# Altium footprint library TIDA_00620.PcbLib: 53 footprints (part 2 of 4)
Each footprint in its own frame and in the unit in brackets; x right, y up, seen from the top. Pads: shape width x height; smd on the part's side, far side on the other; paste and mask are expansions set on the pad; w line width, h text height; cw(c..) or ccw(c..) is an arc to the next point about the centre after c.
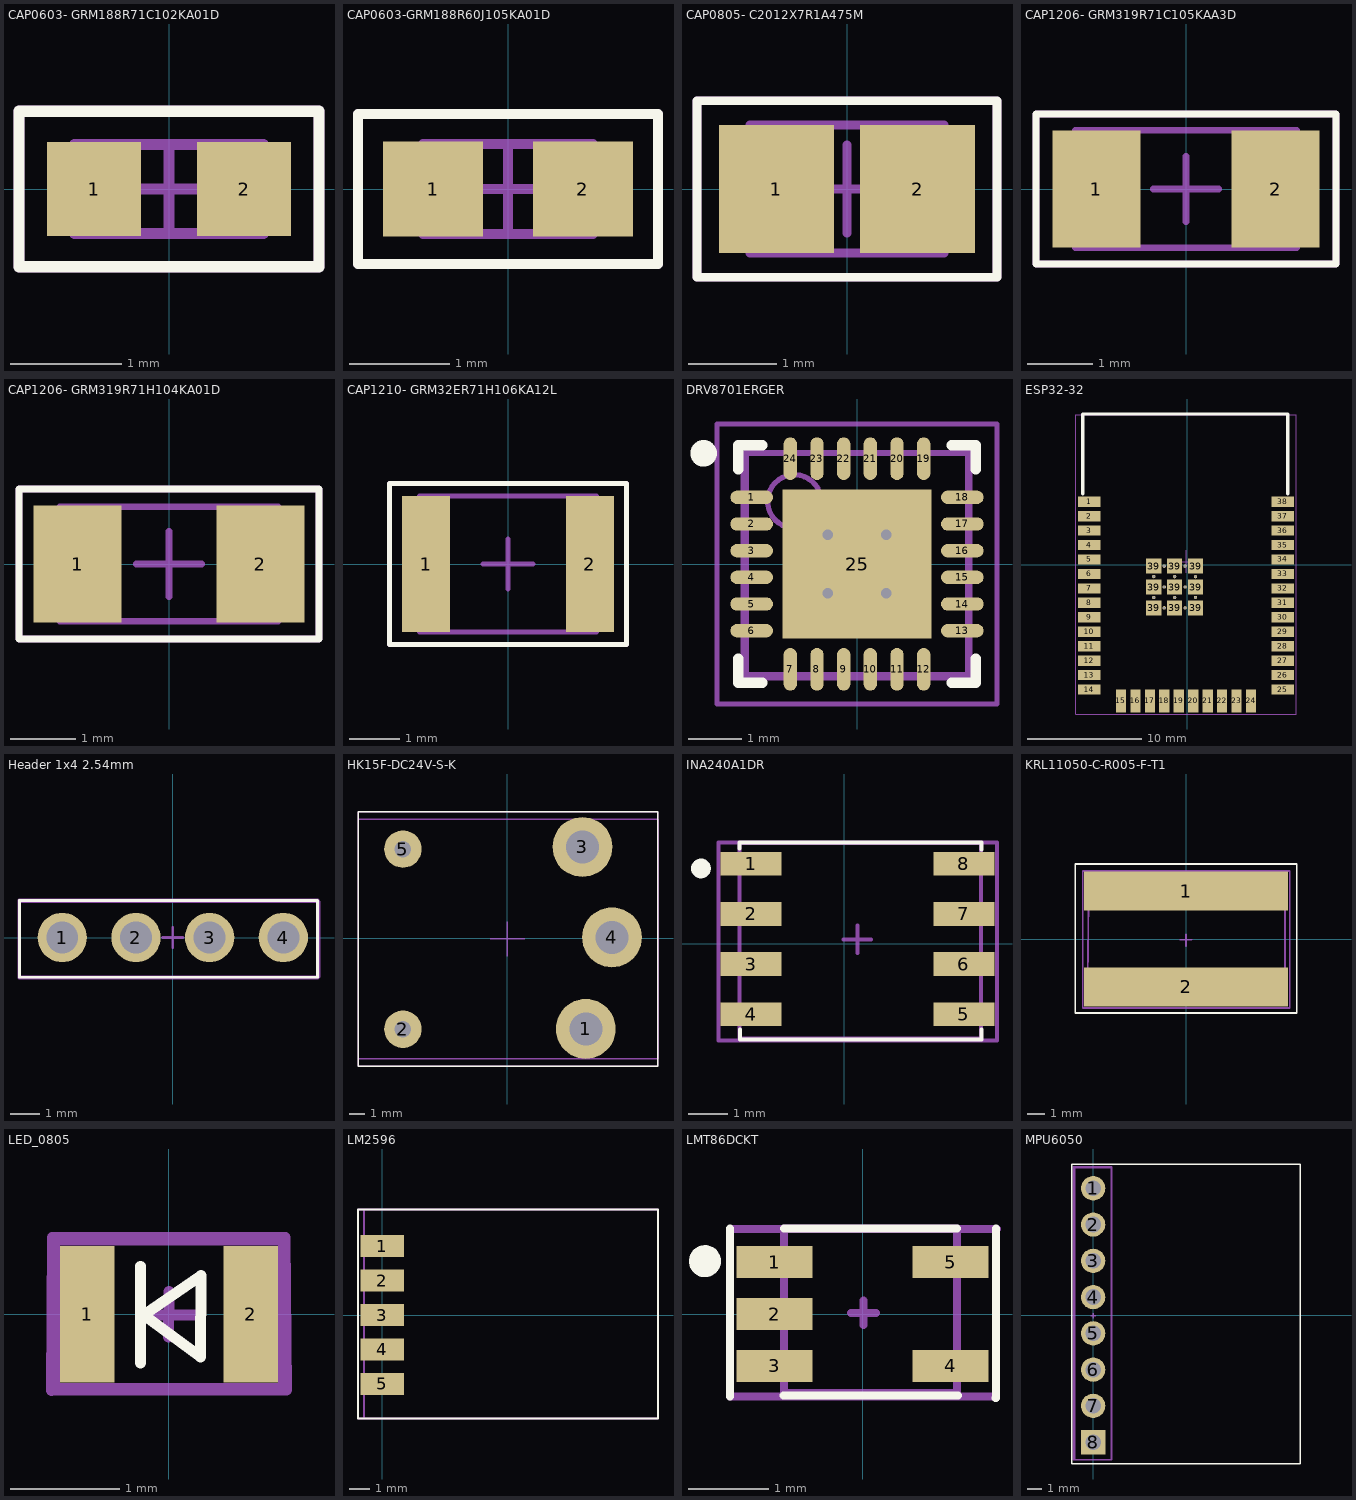
[diagram p1: the footprints below, top view; thin cyan lines are the x and y axes]

## CAP0603- GRM188R71C102KA01D [mm] "Chip Capacitor, 2-Leads, Body 1,60x0,75mm, IPC Medium Density"
height 0.9
pads (2):
  rect 0.85x0.85 smd mask+0.05: 1(-0.675,0) 2(0.675,0)
Top Overlay:
  lines w0.1: -1.35,-0.7 1.35,-0.7 1.35,0.7 -1.35,0.7 -1.35,-0.7
Top 3D Body:
  lines w0.1: -0.85,-0.4 0.85,-0.4 0.85,0.4 -0.85,0.4 -0.85,-0.4
Top Component Center:
  lines w0.1: -0.4,0 0.4,0 ; 0,-0.4 0,0.4 ; -1.35,-0.7 1.35,-0.7 1.35,0.7 -1.35,0.7 -1.35,-0.7
Top Designator:
  text ".Designator" at -0.649,-0.167 h0.5
3D body: height 0.9, standoff 0, extent 0.5,-0.4 0.85,0.4
3D body: height 0.9, standoff 0, extent -0.85,-0.4 -0.5,0.4
3D body: height 0.9, standoff 0, extent -0.5,-0.4 0.5,0.4

## CAP0603-GRM188R60J105KA01D [mm] "Chip Capacitor, 2-Leads, Body 1,60x0,80mm, IPC Medium Density"
height 0.9
pads (2):
  rect 1x0.95 smd mask+0.05: 1(-0.75,0) 2(0.75,0)
Top Overlay:
  lines w0.1: -1.5,-0.75 -1.5,0.75 1.5,0.75 1.5,-0.75 -1.5,-0.75
Top 3D Body:
  lines w0.1: -0.85,-0.45 -0.85,0.45 0.85,0.45 0.85,-0.45 -0.85,-0.45
Top Component Center:
  lines w0.1: -0.45,0 0.45,0 ; 0,-0.45 0,0.45 ; -1.5,-0.75 -1.5,0.75 1.5,0.75 1.5,-0.75 -1.5,-0.75
Top Designator:
  text ".Designator" at -0.167,-0.267 h0.5
3D body: height 0.9, standoff 0, extent -0.5,-0.45 0.5,0.45
3D body: height 0.9, standoff 0, extent -0.85,-0.45 -0.5,0.45
3D body: height 0.9, standoff 0, extent 0.5,-0.45 0.85,0.45

## CAP0805- C2012X7R1A475M [mm] "Chip Capacitor, 2-Leads, Body 2,00x1,25mm, IPC Medium Density"
height 1.45
pads (2):
  rect 1.3x1.45 smd mask+0.05: 1(-0.8,0) 2(0.8,0)
Top Overlay:
  lines w0.1: -1.7,-1 1.7,-1 1.7,1 -1.7,1 -1.7,-1
Top 3D Body:
  lines w0.1: -1.1,-0.725 1.1,-0.725 1.1,0.725 -1.1,0.725 -1.1,-0.725
Top Component Center:
  lines w0.1: -0.5,0 0.5,0 ; 0,-0.5 0,0.5 ; -1.7,-1 1.7,-1 1.7,1 -1.7,1 -1.7,-1
Top Designator:
  text ".Designator" at -0.535,-0.241 h0.5
3D body: height 1.45, standoff 0, extent 0.6,-0.725 1.1,0.725
3D body: height 1.45, standoff 0, extent -1.1,-0.725 -0.6,0.725
3D body: height 1.45, standoff 0, extent -0.6,-0.725 0.6,0.725

## CAP1206- GRM319R71C105KAA3D [mm] "Chip Capacitor, 2-Leads, Body 3,20x1,60mm, IPC Medium Density"
height 0.95
pads (2):
  rect 1.35x1.8 smd mask+0.05: 1(-1.375,0) 2(1.375,0)
Top Overlay:
  lines w0.1: -2.3,-1.15 -2.3,1.15 2.3,1.15 2.3,-1.15 -2.3,-1.15
Top 3D Body:
  lines w0.1: -1.7,-0.9 -1.7,0.9 1.7,0.9 1.7,-0.9 -1.7,-0.9
Top Component Center:
  lines w0.1: -0.5,0 0.5,0 ; 0,-0.5 0,0.5 ; -2.3,-1.15 -2.3,1.15 2.3,1.15 2.3,-1.15 -2.3,-1.15
Top Designator:
  text ".Designator" at -0.367,-0.217 h0.5
3D body: height 0.95, standoff 0, extent -1.15,-0.9 1.15,0.9
3D body: height 0.95, standoff 0, extent -1.7,-0.9 -1.15,0.9
3D body: height 0.95, standoff 0, extent 1.15,-0.9 1.7,0.9

## CAP1206- GRM319R71H104KA01D [mm] "Chip Capacitor, 2-Leads, Body 3,20x1,60mm, IPC Medium Density"
height 0.95
pads (2):
  rect 1.35x1.8 smd mask+0.05: 1(-1.4,0) 2(1.4,0)
Top Overlay:
  lines w0.1: -2.3,-1.15 -2.3,1.15 2.3,1.15 2.3,-1.15 -2.3,-1.15
Top 3D Body:
  lines w0.1: -1.675,-0.875 1.675,-0.875 1.675,0.875 -1.675,0.875 -1.675,-0.875
Top Component Center:
  lines w0.1: -0.5,0 0.5,0 ; 0,-0.5 0,0.5 ; -2.3,-1.15 2.3,-1.15 2.3,1.15 -2.3,1.15 -2.3,-1.15
Top Designator:
  text ".Designator" at -0.267,-0.217 h0.5
3D body: height 0.95, standoff 0, extent 1.125,-0.875 1.675,0.875
3D body: height 0.95, standoff 0, extent -1.675,-0.875 -1.125,0.875
3D body: height 0.95, standoff 0, extent -1.125,-0.875 1.125,0.875

## CAP1210- GRM32ER71H106KA12L [mm] "Chip Capacitor, 2-Leads, Body 3,20x2,50mm, IPC Medium Density"
height 2.7
pads (2):
  rect 0.95x2.7 smd mask+0.05: 1(-1.625,0) 2(1.625,0)
Top Overlay:
  lines w0.1: -2.35,-1.6 -2.35,1.6 2.35,1.6 2.35,-1.6 -2.35,-1.6
Top 3D Body:
  lines w0.1: -1.75,-1.35 -1.75,1.35 1.75,1.35 1.75,-1.35 -1.75,-1.35
Top Component Center:
  lines w0.1: -0.5,0 0.5,0 ; 0,-0.5 0,0.5 ; -2.35,-1.6 -2.35,1.6 2.35,1.6 2.35,-1.6 -2.35,-1.6
Top Designator:
  text ".Designator" at -0.317,-0.217 h0.5
3D body: height 2.7, standoff 0, extent -1.45,-1.35 1.45,1.35
3D body: height 2.7, standoff 0, extent -1.75,-1.35 -1.45,1.35
3D body: height 2.7, standoff 0, extent 1.45,-1.35 1.75,1.35

## DRV8701ERGER [mm] "QFN, 24-Leads, Body 4,00x4,00mm, Pitch 0,50mm, Thermal Pad 2,80x2,80mm, IPC Medium Density"
height 1
pads (25):
  oval 0.8x0.25 smd mask+0.05: 1(-1.975,1.25) 2(-1.975,0.75) 3(-1.975,0.25) 4(-1.975,-0.25) 5(-1.975,-0.75) 6(-1.975,-1.25) 13(1.975,-1.25) 14(1.975,-0.75) 15(1.975,-0.25) 16(1.975,0.25) 17(1.975,0.75) 18(1.975,1.25)
  oval 0.25x0.8 smd mask+0.05: 7(-1.25,-1.975) 8(-0.75,-1.975) 9(-0.25,-1.975) 10(0.25,-1.975) 11(0.75,-1.975) 12(1.25,-1.975) 19(1.25,1.975) 20(0.75,1.975) 21(0.25,1.975) 22(-0.25,1.975) 23(-0.75,1.975) 24(-1.25,1.975)
  rect 2.8x2.8 smd mask+0.05: 25(0,0)
via 0.55,-0.55 diameter 0.5 hole 0.2
via -0.55,-0.55 diameter 0.5 hole 0.2
via 0.55,0.55 diameter 0.5 hole 0.2
via -0.55,0.55 diameter 0.5 hole 0.2
Top Overlay:
  circle w0.25: c-2.875,2.075 r0.125
  lines w0.2: -2.225,-1.775 -2.225,-2.225 -1.775,-2.225 ; -2.225,1.775 -2.225,2.225 -1.775,2.225 ; 1.775,-2.225 2.225,-2.225 2.225,-1.775 ; 1.775,2.225 2.225,2.225 2.225,1.775
Top 3D Body:
  circle w0.1: c-1.175,1.175 r0.5
  lines w0.1: -2.1,2.07 -2.13,2.07 -2.13,-2.13 2.12,-2.13 2.12,2.07 ; -2.1,2.09 2.12,2.09 ; -2.075,-2.075 2.075,-2.075 2.075,2.075 -2.075,2.075 -2.075,-2.075
Top Component Center:
  lines w0.1: -0.5,0 0.5,0 ; 0,-0.5 0,0.5 ; -2.625,-2.625 2.625,-2.625 2.625,2.625 -2.625,2.625 -2.625,-2.625
3D body: height 1, standoff 0, extent -2.075,-2.075 2.075,2.075

## ESP32-32 [mm]
pads (59):
  rect 2x0.9 smd mask+0.05: 1(-8.608,5.555) 2(-8.608,4.285) 3(-8.608,3.015) 4(-8.608,1.745) 5(-8.608,0.475) 6(-8.608,-0.795) 7(-8.608,-2.065) 8(-8.608,-3.335) 9(-8.608,-4.605) 10(-8.608,-5.875) 11(-8.608,-7.145) 12(-8.608,-8.415) 13(-8.608,-9.685) 14(-8.608,-10.955) 25(8.393,-10.955) 26(8.393,-9.685) 27(8.393,-8.415) 28(8.393,-7.145) 29(8.393,-5.875) 30(8.393,-4.605) 31(8.393,-3.335) 32(8.393,-2.065) 33(8.393,-0.795) 34(8.393,0.475) 35(8.393,1.745) 36(8.393,3.015) 37(8.393,4.285) 38(8.393,5.555)
  rect 0.9x2 smd mask+0.05: 15(-5.823,-11.955) 16(-4.553,-11.955) 17(-3.283,-11.955) 18(-2.013,-11.955) 19(-0.743,-11.955) 20(0.527,-11.955) 21(1.797,-11.955) 22(3.067,-11.955) 23(4.337,-11.955) 24(5.607,-11.955)
  rect 1.33x1.33 smd mask+0.05: 39(-2.943,-3.78) 39(-2.943,-1.945) 39(-2.943,-0.11) 39(-1.108,-3.78) 39(-1.108,-1.945) 39(-1.108,-0.11) 39(0.727,-3.78) 39(0.727,-1.945) 39(0.727,-0.11)
  round 0.3 hole 0.2 mask+0.05: 39(-2.943,-2.862) 39(-2.943,-1.027) 39(-2.025,-3.78) 39(-2.025,-1.945) 39(-2.025,-0.11) 39(-1.108,-2.862) 39(-1.108,-1.027) 39(-0.19,-3.78) 39(-0.19,-1.945) 39(-0.19,-0.11) 39(0.727,-2.862) 39(0.727,-1.027)
Top Overlay:
  lines w0.3: -9.178,6.263 -9.178,13.263 8.822,13.263 8.822,6.263
Top Component Center:
  lines w0.1: -1.108,0.295 0.893,0.295 ; -0.108,-0.705 -0.108,1.295 ; -9.808,-13.105 9.593,-13.105 9.593,13.195 -9.808,13.195 -9.808,-13.105
Top Designator:
  lines w0.1: -9.808,-13.105 9.593,-13.105 9.593,13.195 -9.808,13.195 -9.808,-13.105
  text ".Designator" at -3.953,1.057 h1.52
3D body "ESP-32 .step": height 2.61, standoff -0.1, extent -9.081,-12.305 8.819,13.095

## Header 1x4 2.54mm [mm]
pads (4):
  round 1.7 hole 1.1 paste-2539.97 mask+0.05: 1(-3.81,0) 2(-1.27,0) 3(1.27,0) 4(3.81,0)
Top Overlay:
  lines w0.1: -5.29,1.28 4.99,1.28 4.99,-1.37 -5.28,-1.37 -5.28,1.28 -5.29,1.28
Top 3D Body:
  lines w0.1: -5.3,-1.36 5.04,-1.36 5.04,1.24 -5.2,1.24 -5.3,1.24 -5.3,-1.36
Top Component Center:
  lines w0.1: -0.35,0 0.35,0 ; 0,-0.35 0,0.35 ; -5.3,-1.4 -5.3,1.3 5,1.3 5,-1.4 -5.3,-1.4
Top Designator:
  text ".Designator" at 1.313,-0.162 h0.5
3D body "4PinHeader.step": height 6.5, standoff -2.5, extent -5.21,-1.3 4.95,1.24

## HK15F-DC24V-S-K [mm]
pads (5):
  round 4 hole 2.2 mask+0.05: 1(5.225,-6.06) 3(5.005,6.08) 4(6.975,0.05)
  round 2.5 hole 1.1 mask+0.05: 2(-6.975,-6.08) 5(-6.975,5.94)
Top Overlay:
  lines w0.1: -9.975,-8.56 -9.975,8.44 -9.875,8.44 10.025,8.44 10.025,-8.56 -9.975,-8.56
Top 3D Body:
  lines w0.1: -9.955,-8.06 -9.955,7.94 10.045,7.94 10.045,-8.06 -9.955,-8.06
Top Component Center:
  lines w0.1: -1.15,-0.05 1.15,-0.05 ; 0,-1.2 0,1.1 ; -9.975,-8.56 -9.975,8.44 10.025,8.44 10.025,-8.56 -9.975,-8.56
Top Designator:
  text "'.Designator'" at -2.232,-1.352 h1.5
3D body "User Library-RELAY  12MMx12MM SQUARE.step": height 2, standoff -15, extent -9.955,-8.06 10.045,7.94

## INA240A1DR [mm]
pads (8):
  rect 1.55x0.6 smd mask+0.05: 1(-2.37,2.025) 2(-2.37,0.755) 3(-2.37,-0.515) 4(-2.37,-1.785) 5(3.03,-1.785) 6(3.03,-0.515) 7(3.03,0.755) 8(3.03,2.025)
Top Overlay:
  circle w0.3: c-3.64,1.91 r0.1
  lines w0.1: -2.66,2.42 -2.66,2.57 3.48,2.57 3.48,2.39 3.47,2.39 ; -2.65,-2.17 -2.65,-2.43 3.48,-2.43 3.48,-2.17
Top 3D Body:
  lines w0.1: -2.6,2.555 -2.66,2.555 ; -2.66,2.555 3.46,2.555 3.46,-2.405 -2.66,-2.405 -2.66,2.555
Top Component Center:
  lines w0.1: -0.02,0.11 0.68,0.11 ; 0.33,-0.24 0.33,0.46 ; -3.2,-2.46 3.87,-2.46 3.87,2.57 -3.2,2.57 -3.2,-2.46
Top Designator:
  text "'.Designator'" at -1.21,-0.61 h1.5
3D body "INA240A1D.STEP": height 1.75, standoff 0, extent -2.595,-2.347 3.395,2.558

## KRL11050-C-R005-F-T1 [mm]
pads (2):
  rect 11.5x2.2 smd mask+0.05: 1(0,2.7) 2(0,-2.7)
Top Overlay:
  lines w0.1: -6.24,-4.17 -6.24,4.22 6.24,4.22 6.24,-4.17 -6.24,-4.17
Top 3D Body:
  lines w0.1: -5.53,-2.61 -5.5,2.51 5.58,2.43 5.58,-2.61 -5.53,-2.61
Top Component Center:
  lines w0.1: -5.77,3.83 -5.82,3.83 ; -0.336,-0.041 0.324,-0.041 ; 0,-0.39 0,0.27 ; -5.82,3.83 5.84,3.83 5.84,-3.89 -5.82,-3.89 -5.82,3.83
Top Designator:
  text ".Designator" at -0.629,-0.167 h0.5
3D body "KRL11050-C-R005-F-T1.STEP": height 0.7, standoff 0, extent -5.48,-2.55 5.52,2.45

## LED_0805 [mm] "LTST-C170KRKT, LTST-C171GKT"
pads (2):
  rect 0.5x1.25 smd mask+0.05: 1(-0.749,0) 2(0.749,0)
Top Overlay:
  lines w0.1: -0.26,-0.445 -0.26,0.44 ; -0.23,-0.005 0.29,-0.39 0.295,0.355 -0.23,-0.005
Top 3D Body:
  lines w0.1: -1.05,-0.68 1.05,-0.68 1.05,0.68 -1.05,0.68 -1.05,-0.68
Top Component Center:
  lines w0.1: -0.225,-0.005 0.245,-0.005 ; -0.005,-0.21 0,0.21 ; -1.075,-0.7 1.075,-0.695 1.065,0.705 -1.07,0.705 -1.075,-0.7
Top Designator:
  text ".Designator" at -0.312,-0.277 h0.5
3D body "LTST-C170KRKT.STEP": height 1.1, standoff 0, extent -1,-0.625 1,0.625

## LM2596 [mm] "LM2596 SIMPLE SWITCHER® Power Converter 150-kHz / 3-A Step-Down Voltage Regulator"
pads (5):
  rect 2.16x1.07 smd mask+0.05: 1(0,3.4) 2(0,1.7) 3(0,0) 4(0,-1.7) 5(0,-3.4)
Top Overlay:
  lines w0.1: -1.2,-5.1 -1.2,5.2 13.6,5.2 13.6,-5.1 -1.2,-5.1
Top 3D Body:
  lines w0.1: -0.9,-5.1 13.6,-5.1 13.6,5.2 -0.8,5.2 -0.9,5.2 -0.9,-5.1
Top Component Center:
  lines w0.1: -0.4,0 0.4,0 ; 0,-0.4 0,0.4 ; -1.2,-5.1 -1.2,5.2 13.6,5.2 13.6,-5.1 -1.2,-5.1
3D body "LM2596S-5.0.STEP": height 4.65, standoff -0.15, extent -0.835,-5.03 13.516,5.13

## LMT86DCKT [mm]
pads (5):
  rect 0.95x0.4 smd mask+0.05: 1(-1.1,0.65) 2(-1.1,0) 3(-1.1,-0.65) 4(1.1,-0.65) 5(1.1,0.65)
Top Overlay:
  circle w0.2: c-1.97,0.66 r0.1
  lines w0.1: -1.66,-1.03 -1.66,1.07 ; -0.99,-1.02 1.19,-1.02 ; -0.98,1.07 1.18,1.07 ; 1.66,-1.05 1.67,-1.05 1.67,1.07
Top 3D Body:
  lines w0.1: -0.98,-0.99 -0.98,1.07 -0.97,1.07 1.18,1.07 1.18,-0.99 -0.98,-0.99
Top Component Center:
  lines w0.1: -0.145,0.015 0.165,0.015 ; 0.01,-0.14 0.01,0.17 ; -1.66,-1.03 -1.66,1.04 -1.66,1.06 -0.98,1.06 1.68,1.06 1.67,1.06 1.67,-1.03 -1.66,-1.03
Top Designator:
  text ".Designator" at -0.619,-0.277 h0.5
3D body "LMT86DCKT.STEP": height 1.1, standoff 0, extent -0.97,-0.96 1.13,1.04

## MPU6050 [mm]
pads (8):
  round 1.7 hole 1.1 paste-2539.97 mask+0.05: 1(0,8.89) 2(0,6.35) 3(0,3.81) 4(0,1.27) 5(0,-1.27) 6(0,-3.81) 7(0,-6.35)
  rect 1.7x1.7 hole 1.1 paste-2539.97 mask+0.05: 8(0,-8.89)
Top Overlay:
  lines w0.1: 14.5,-10.42 14.5,10.58 ; 14.5,-10.41 -1.5,-10.41 -1.5,10.59 14.5,10.59
Top 3D Body:
  lines w0.1: -1.3,-10.11 -1.3,10.31 1.25,10.31 1.25,-10.11 -1.3,-10.11
Top Component Center:
  lines w0.1: -1.39,-10.11 -1.39,0.08 ; -1.38,-10.11 1.3,-10.11 1.3,0.08 1.3,10.38 -1.4,10.38 -1.4,0.08 -1.38,0.08 ; -0.18,-0.04 0.18,-0.04 ; -0.01,0.14 0,0.14 0,-0.22
Top Designator:
  text ".Designator" at -0.162,3.767 h0.5
3D body "Stiftleiste.step": height 5.48, standoff -5.52, extent -1.29,-10.129 1.21,10.3